# Altium footprint library C210_Rev_B_220601.PcbLib: 80 footprints (part 2 of 5)
Each footprint in its own frame and in the unit in brackets; x right, y up, seen from the top. Pads: shape width x height; smd on the part's side, far side on the other; paste and mask are expansions set on the pad; w line width, h text height; cw(c..) or ccw(c..) is an arc to the next point about the centre after c.
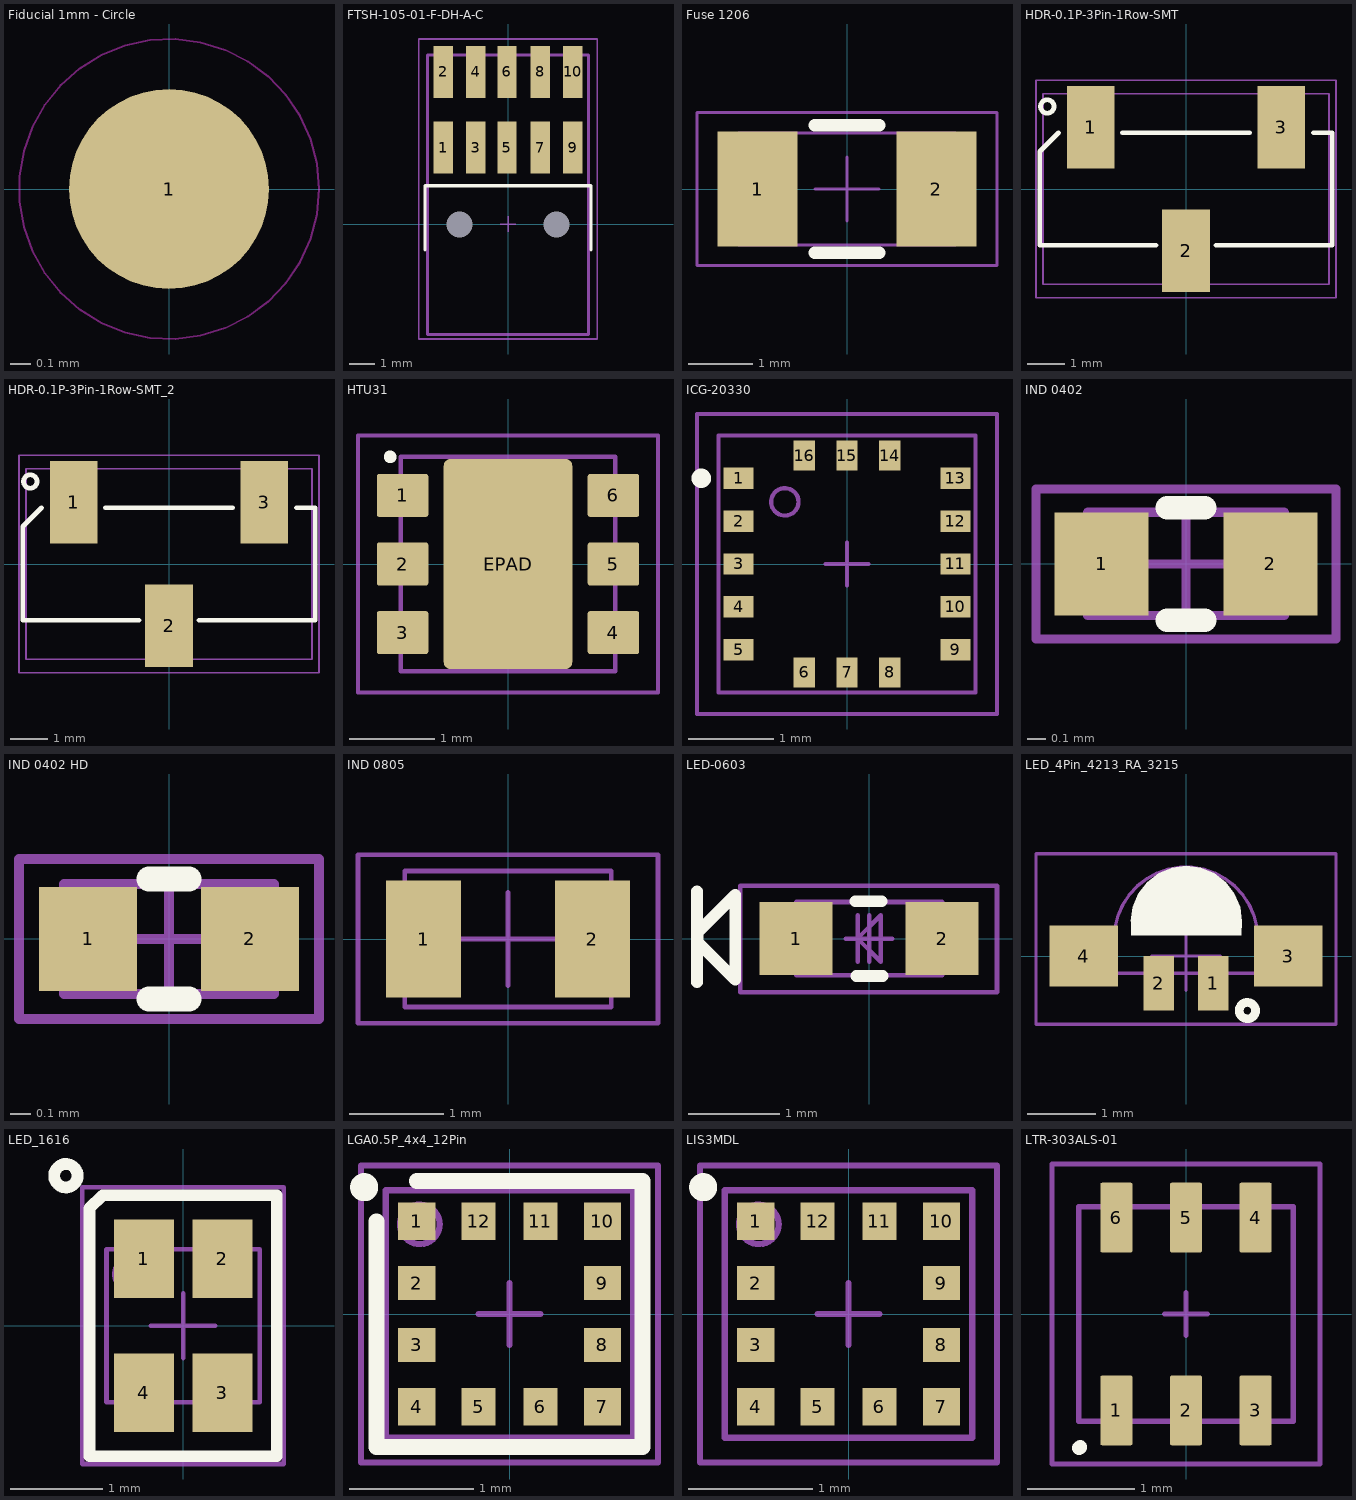
[diagram p1: the footprints below, top view; thin cyan lines are the x and y axes]

## Fiducial 1mm - Circle [mm]
pads (1):
  round 1 smd paste-10: 1(0,0)
Top Layer keep-out:
  circle w0.01: c0,0 r0.75
Top Solder:
  circle w0.75: c0,0 r0.375

## FTSH-105-01-F-DH-A-C [mm]
pads (12):
  rect 0.76x2.03 smd: 1(-2.54,3) 2(-2.54,5.96) 3(-1.27,3) 4(-1.27,5.96) 5(-0.04,3) 6(-0.04,5.96) 7(1.27,3) 8(1.27,5.96) 9(2.54,3) 10(2.54,5.96)
  round 0 hole 1.02 unplated: MH1(-1.905,-0.023) MH1(1.905,-0.023)
Top Overlay:
  lines w0.127: -3.25,-1 -3.25,1.5 0,1.5 3.25,1.5 3.25,-1
Mechanical 11:
  text ".Designator" at -0.3,0.342 h0.5
Mechanical 13:
  lines w0.127: -3.15,-4.325 -3.15,6.625 3.15,6.625 3.15,-4.325 -3.15,-4.325
Mechanical 15:
  lines w0.05: -0.3,0 0.3,0 ; 0,-0.3 0,0.3
  lines w0.064: -3.5,-4.5 3.5,-4.5 3.5,7.25 -3.5,7.25 -3.5,-4.5
3D body "FTSH-105-01-F-DH-A-C.stp": height 3.57, standoff -1, extent -3.175,-4.312 3.175,6.584

## Fuse 1206 [mm]
pads (2):
  rect 1.25x1.8 smd: 1(-1.4,0) 2(1.4,0)
Top Overlay:
  lines w0.2: -0.5,-1 0.5,-1 ; -0.5,1 0.5,1
Mechanical 11:
  text ".Designator" at -0.325,-0.275 h0.5
Mechanical 13:
  lines w0.05: -1.7,-0.875 -1.7,0.875 1.7,0.875 1.7,-0.875 -1.7,-0.875
Mechanical 15:
  lines w0.05: -0.5,0 0.5,0 ; 0,-0.5 0,0.5 ; -2.35,-1.2 -2.35,1.2 2.35,1.2 2.35,-1.2 -2.35,-1.2
3D body: height 0.75, standoff 0, extent -1.2,-0.875 1.2,0.875
3D body: height 0.75, standoff 0, extent -1.7,-0.875 -1.2,0.875
3D body: height 0.75, standoff 0, extent 1.2,-0.875 1.7,0.875

## HDR-0.1P-3Pin-1Row-SMT [mm]
pads (3):
  rect 1.27x2.2 smd: 1(-2.54,1.65) 2(0,-1.65) 3(2.54,1.65)
Top Overlay:
  circle w0.127: c-3.7,2.2 r0.18
  lines w0.127: -3.4,1.5 -3.9,1 -3.9,-1.5 -0.8,-1.5 ; -1.7,1.5 1.7,1.5 ; 0.8,-1.5 1.95,-1.5 3.9,-1.5 3.9,1.5 3.4,1.5
Mechanical 11:
  text ".Designator" at 0.575,0.225 h0.5
Mechanical 13:
  lines w0.05: -3.81,2.54 3.81,2.54
  lines w0.051: -3.81,2.54 -3.81,-2.54 3.81,-2.54 3.81,2.54
Mechanical 15:
  lines w0.051: -4,-2.9 -4,2.9 4,2.9 4,-2.9 -4,-2.9
3D body: height 4.13, standoff 1.59, extent -3.81,-1.27 3.81,1.27
3D body: height 9.93, standoff 0, extent 2.21,-0.33 2.87,0.33
3D body: height 9.93, standoff 0, extent -0.358,-0.33 0.303,0.33
3D body: height 9.93, standoff 0, extent -2.87,-0.33 -2.21,0.33
3D body: height 0.64, standoff 0, extent 2.21,-0.005 2.87,2.54
3D body: height 0.64, standoff 0, extent -0.358,-2.545 0.303,0.005
3D body: height 0.64, standoff 0, extent -2.87,-0.005 -2.21,2.54

## HDR-0.1P-3Pin-1Row-SMT_2 [mm]
pads (3):
  rect 1.27x2.2 smd: 1(-2.54,1.65) 2(0,-1.65) 3(2.54,1.65)
Top Overlay:
  circle w0.127: c-3.7,2.2 r0.18
  lines w0.127: -3.4,1.5 -3.9,1 -3.9,-1.5 -0.8,-1.5 ; -1.7,1.5 1.7,1.5 ; 0.8,-1.5 1.95,-1.5 3.9,-1.5 3.9,1.5 3.4,1.5
Mechanical 11:
  text ".Designator" at -0.575,-0.25 h0.5
Mechanical 13:
  lines w0.05: -3.81,2.54 3.81,2.54
  lines w0.051: -3.81,2.54 -3.81,-2.54 3.81,-2.54 3.81,2.54
Mechanical 15:
  lines w0.051: -4,-2.9 4,-2.9 4,2.9 -4,2.9 -4,-2.9
3D body: height 0.64, standoff 0, extent -2.87,-0.005 -2.21,2.54
3D body: height 0.64, standoff 0, extent -0.358,-2.545 0.303,0.005
3D body: height 0.64, standoff 0, extent 2.21,-0.005 2.87,2.54
3D body: height 9.93, standoff 0, extent -2.87,-0.33 -2.21,0.33
3D body: height 9.93, standoff 0, extent -0.358,-0.33 0.303,0.33
3D body: height 9.93, standoff 0, extent 2.21,-0.33 2.87,0.33
3D body: height 4.13, standoff 1.59, extent -3.81,-1.27 3.81,1.27

## HTU31 [mm]
pads (7):
  rrect10% 0.6x0.5 smd mask+0.05: 1(-1.23,0.8) 2(-1.23,0) 3(-1.23,-0.8) 4(1.23,-0.8) 5(1.23,0) 6(1.23,0.8)
  rrect10% 1.5x2.45 smd mask+0.05: EPAD(0,0)
Top Overlay:
  circle w0.127: c-1.375,1.25 r0.01
Mechanical 11:
  text ".Designator" at -0.5,-0.5 h0.5
Mechanical 13:
  lines w0.05: -1.25,-1.25 -1.25,1.25 1.25,1.25 1.25,-1.25 -1.25,-1.25
Mechanical 15:
  lines w0.05: -0.2,0 0.2,0 ; 0,-0.2 0,0.2 ; -1.75,-1.5 1.75,-1.5 1.75,1.5 -1.75,1.5 -1.75,-1.5
3D body "c-10142048-00-a-3d.stp": height 0.93, standoff 0.01, extent -1.25,-1.25 1.25,1.25

## ICG-20330 [mm]
pads (16):
  rect 0.35x0.25 smd mask+0.05: 1(-1.265,1) 2(-1.265,0.5) 3(-1.265,0) 4(-1.265,-0.5) 5(-1.265,-1) 9(1.265,-1) 10(1.265,-0.5) 11(1.265,0) 12(1.265,0.5) 13(1.265,1)
  rect 0.25x0.35 smd mask+0.05: 6(-0.5,-1.265) 7(0,-1.265) 8(0.5,-1.265) 14(0.5,1.265) 15(0,1.265) 16(-0.5,1.265)
Top Overlay:
  circle w0.127: c-1.7,1 r0.05
Mechanical 11:
  text ".Designator" at -0.825,-0.225 h0.5
Mechanical 13:
  circle w0.05: c-0.725,0.725 r0.16
  lines w0.05: -1.5,-1.5 -1.5,1.5 1.5,1.5 1.5,-1.5 -1.5,-1.5
Mechanical 15:
  lines w0.05: -0.25,0 0.25,0 ; 0,-0.25 0,0.25 ; 0,-0.1 0,0.1 ; -1.75,-1.75 -1.75,1.75 1.75,1.75 1.75,-1.75 -1.75,-1.75
3D body "User Library-LIS331AL.step": height 1.03, standoff 0.01, extent -1.5,-1.5 1.5,1.5

## IND 0402 [mm]
pads (2):
  rect 0.5x0.55 smd: 1(-0.45,0) 2(0.45,0)
Top Overlay:
  lines w0.127: -0.1,-0.3 0.1,-0.3 ; -0.1,0.3 0.1,0.3
Mechanical 11:
  text ".Designator" at 0.45,0.35 h0.5
Mechanical 13:
  lines w0.05: -0.525,-0.275 0.525,-0.275 0.525,0.275 -0.525,0.275 -0.525,-0.275
Mechanical 15:
  lines w0.05: -0.275,0 0.275,0 ; 0,-0.275 0,0.275 ; -0.8,-0.4 0.8,-0.4 0.8,0.4 -0.8,0.4 -0.8,-0.4
3D body: height 0.55, standoff 0, extent -0.275,-0.275 0.275,0.275
3D body: height 0.55, standoff 0, extent -0.525,-0.275 -0.275,0.275
3D body: height 0.55, standoff 0, extent 0.275,-0.275 0.525,0.275

## IND 0402 HD [mm]
pads (2):
  rect 0.49x0.52 smd: 1(-0.405,0) 2(0.405,0)
Top Overlay:
  lines w0.127: -0.1,-0.3 0.1,-0.3 ; -0.1,0.3 0.1,0.3
Mechanical 11:
  text ".Designator" at -0.237,-0.25 h0.5
Mechanical 13:
  lines w0.05: -0.525,-0.275 -0.525,0.275 0.525,0.275 0.525,-0.275 -0.525,-0.275
Mechanical 15:
  lines w0.05: -0.275,0 0.275,0 ; 0,-0.275 0,0.275 ; -0.75,-0.4 -0.75,0.4 0.75,0.4 0.75,-0.4 -0.75,-0.4
3D body: height 0.55, standoff 0, extent 0.275,-0.275 0.525,0.275
3D body: height 0.55, standoff 0, extent -0.525,-0.275 -0.275,0.275
3D body: height 0.55, standoff 0, extent -0.275,-0.275 0.275,0.275

## IND 0805 [mm]
pads (2):
  rect 0.8x1.25 smd: 1(-0.9,0) 2(0.9,0)
Mechanical 11:
  text ".Designator" at -0.925,-0.25 h0.5
Mechanical 13:
  lines w0.05: -1.1,-0.725 -1.1,0.725 1.1,0.725 1.1,-0.725 -1.1,-0.725
Mechanical 15:
  lines w0.05: -0.5,0 0.5,0 ; 0,-0.5 0,0.5 ; -1.6,-0.9 -1.6,0.9 1.6,0.9 1.6,-0.9 -1.6,-0.9
3D body: height 1.4, standoff 0, extent -0.6,-0.725 0.6,0.725
3D body: height 1.4, standoff 0, extent -1.1,-0.725 -0.6,0.725
3D body: height 1.4, standoff 0, extent 0.6,-0.725 1.1,0.725

## LED-0603 [mm]
pads (2):
  rect 0.8x0.8 smd: 1(-0.8,0) 2(0.8,0)
Top Overlay:
  lines w0.127: -1.885,-0.48 -1.885,0.52 ; -0.15,0.41 0.14,0.41 ; -0.14,-0.41 0.15,-0.41 ; -1.875,-0.04 -1.875,0.07 -1.465,0.48 -1.465,-0.45 -1.875,-0.04
Mechanical 11:
  text ".Designator" at -0.55,-0.2 h0.5
Mechanical 13:
  lines w0.05: -0.127,-0.254 -0.127,0.254 ; -0.8,-0.4 -0.8,0.4 0.8,0.4 0.8,-0.4 -0.8,-0.4 ; -0.127,0 0.127,0.254 0.127,-0.254 -0.127,0
Mechanical 15:
  lines w0.05: -0.254,0 0.254,0 ; 0,-0.254 0,0.254 ; -1.41,-0.59 -1.41,0.58 1.4,0.58 1.4,-0.59 -1.41,-0.59
3D body "User Library-LED_0603_B.STEP": height 0.6, standoff 0, extent -0.8,-0.4 0.8,0.4

## LED_4Pin_4213_RA_3215 [mm]
pads (4):
  rect 0.45x0.8 smd: 1(0.4,-0.4) 2(-0.4,-0.4)
  rect 1x0.9 smd: 3(1.5,0) 4(-1.5,0)
Top Overlay:
  circle w0.127: c0.9,-0.8 r0.12
  region: -0.8,0.305 0.813,0.305 0.82,0.508 0.792,0.719 0.711,0.915 0.582,1.083 0.413,1.212 0.217,1.294 0.006,1.321 -0.204,1.294 -0.4,1.212 -0.569,1.083 -0.698,0.915 -0.779,0.719 -0.807,0.508 -0.8,0.508
Mechanical 11:
  text ".Designator" at 0.675,0.125 h0.5
Mechanical 13:
  lines w0.05: -1.055,0.25 cw(c0,0.25) 1.055,0.25 ; -1.051,0.25 -1.6,0.25 -1.6,-0.25 1.6,-0.25 1.6,0.25 1.06,0.25
Mechanical 15:
  lines w0.05: -0.5,0 0.5,0 ; 0,-0.5 0,0.5 ; -2.2,-1 2.2,-1 2.2,1.5 -2.2,1.5 -2.2,-1
3D body: height 1.1, standoff 0, extent -1.6,-0.25 1.6,0.25
3D body: height 1.1, standoff 0, extent -1.051,0.249 1.051,1.301

## LED_1616 [mm]
pads (4):
  rect 0.65x0.85 smd: 1(-0.425,0.725) 2(0.425,0.725) 3(0.425,-0.725) 4(-0.425,-0.725)
Top Overlay:
  circle w0.127: c-1.27,1.626 r0.127
  lines w0.127: -1.015,-1.415 -1.015,1.271 -0.871,1.415 1.015,1.415 1.015,-1.415 -1.015,-1.415
Mechanical 11:
  text ".Designator" at 0.45,-1.05 h0.5
Mechanical 13:
  circle w0.05: c-0.584,0.559 r0.163
  lines w0.05: -0.83,-0.83 0.83,-0.83 0.83,0.83 -0.83,0.83 -0.83,-0.83
Mechanical 15:
  lines w0.05: -0.35,0 0.35,0 ; 0,-0.35 0,0.35 ; -1.092,-1.499 1.092,-1.499 1.092,1.499 -1.092,1.499 -1.092,-1.499
3D body: height 0.4, standoff 0, extent -0.829,-0.829 0.829,0.829

## LGA0.5P_4x4_12Pin [mm]
pads (12):
  rect 0.3x0.3 smd mask+0.05: 1(-0.75,0.75) 4(-0.75,-0.75) 7(0.75,-0.75) 10(0.75,0.75)
  rect 0.3x0.275 smd mask+0.05: 2(-0.75,0.25) 3(-0.75,-0.25) 8(0.75,-0.25) 9(0.75,0.25)
  rect 0.275x0.3 smd mask+0.05: 5(-0.25,-0.75) 6(0.25,-0.75) 11(0.25,0.75) 12(-0.25,0.75)
Top Overlay:
  circle w0.127: c-1.175,1.025 r0.05
  lines w0.127: -1.075,0.75 -1.075,-1.075 1.075,-1.075 1.075,1.075 -0.75,1.075
Mechanical 11:
  text ".Designator" at -0.35,0.625 h0.5
Mechanical 13:
  circle w0.05: c-0.725,0.725 r0.16
  lines w0.05: -1,-1 -1,1 1,1 1,-1 -1,-1
Mechanical 15:
  lines w0.05: -0.25,0 0.25,0 ; 0,-0.25 0,0.25 ; 0,-0.1 0,0.1 ; -1.2,-1.2 -1.2,1.2 1.2,1.2 1.2,-1.2 -1.2,-1.2
3D body: height 1, standoff 0, extent -1,-1 1,1

## LIS3MDL [mm]
pads (12):
  rect 0.3x0.3 smd mask+0.05: 1(-0.75,0.75) 4(-0.75,-0.75) 7(0.75,-0.75) 10(0.75,0.75)
  rect 0.3x0.275 smd mask+0.05: 2(-0.75,0.25) 3(-0.75,-0.25) 8(0.75,-0.25) 9(0.75,0.25)
  rect 0.275x0.3 smd mask+0.05: 5(-0.25,-0.75) 6(0.25,-0.75) 11(0.25,0.75) 12(-0.25,0.75)
Top Overlay:
  circle w0.127: c-1.175,1.025 r0.05
Mechanical 11:
  text ".Designator" at 0.775,0.275 h0.5
Mechanical 13:
  circle w0.05: c-0.725,0.725 r0.16
  lines w0.05: -1,-1 -1,1 1,1 1,-1 -1,-1
Mechanical 15:
  lines w0.05: -0.25,0 0.25,0 ; 0,-0.25 0,0.25 ; 0,-0.1 0,0.1 ; -1.2,-1.2 -1.2,1.2 1.2,1.2 1.2,-1.2 -1.2,-1.2
3D body "User Library-LIS2DW12.step": height 0.71, standoff 0.01, extent -1,-1 1,1

## LTR-303ALS-01 [mm]
pads (6):
  rrect10% 0.3x0.65 smd mask+0.05: 1(-0.65,-0.9) 2(0,-0.9) 3(0.65,-0.9) 4(0.65,0.9) 5(0,0.9) 6(-0.65,0.9)
Top Overlay:
  lines w0.127: -1,-1.25 ccw(c-0.998,-1.24) -0.988,-1.24
Mechanical 11:
  text ".Designator" at -0.6,-0.15 h0.5
Mechanical 13:
  lines w0.05: -1,-1 1,-1 1,1 -1,1 -1,-1
Mechanical 15:
  lines w0.05: -0.2,0 0.2,0 ; 0,-0.2 0,0.2 ; -1.25,-1.4 1.25,-1.4 1.25,1.4 -1.25,1.4 -1.25,-1.4
3D body: height 0.3, standoff 0.01, extent -1,-1 1,1
3D body: height 0.7, standoff 0.3, extent -1,-1 1,1